# Altium footprint library devices.PCBLIB: 335 footprints (part 15 of 21)
Each footprint in its own frame and in the unit in brackets; x right, y up, seen from the top. Pads: shape width x height; smd on the part's side, far side on the other; paste and mask are expansions set on the pad; w line width, h text height; cw(c..) or ccw(c..) is an arc to the next point about the centre after c.
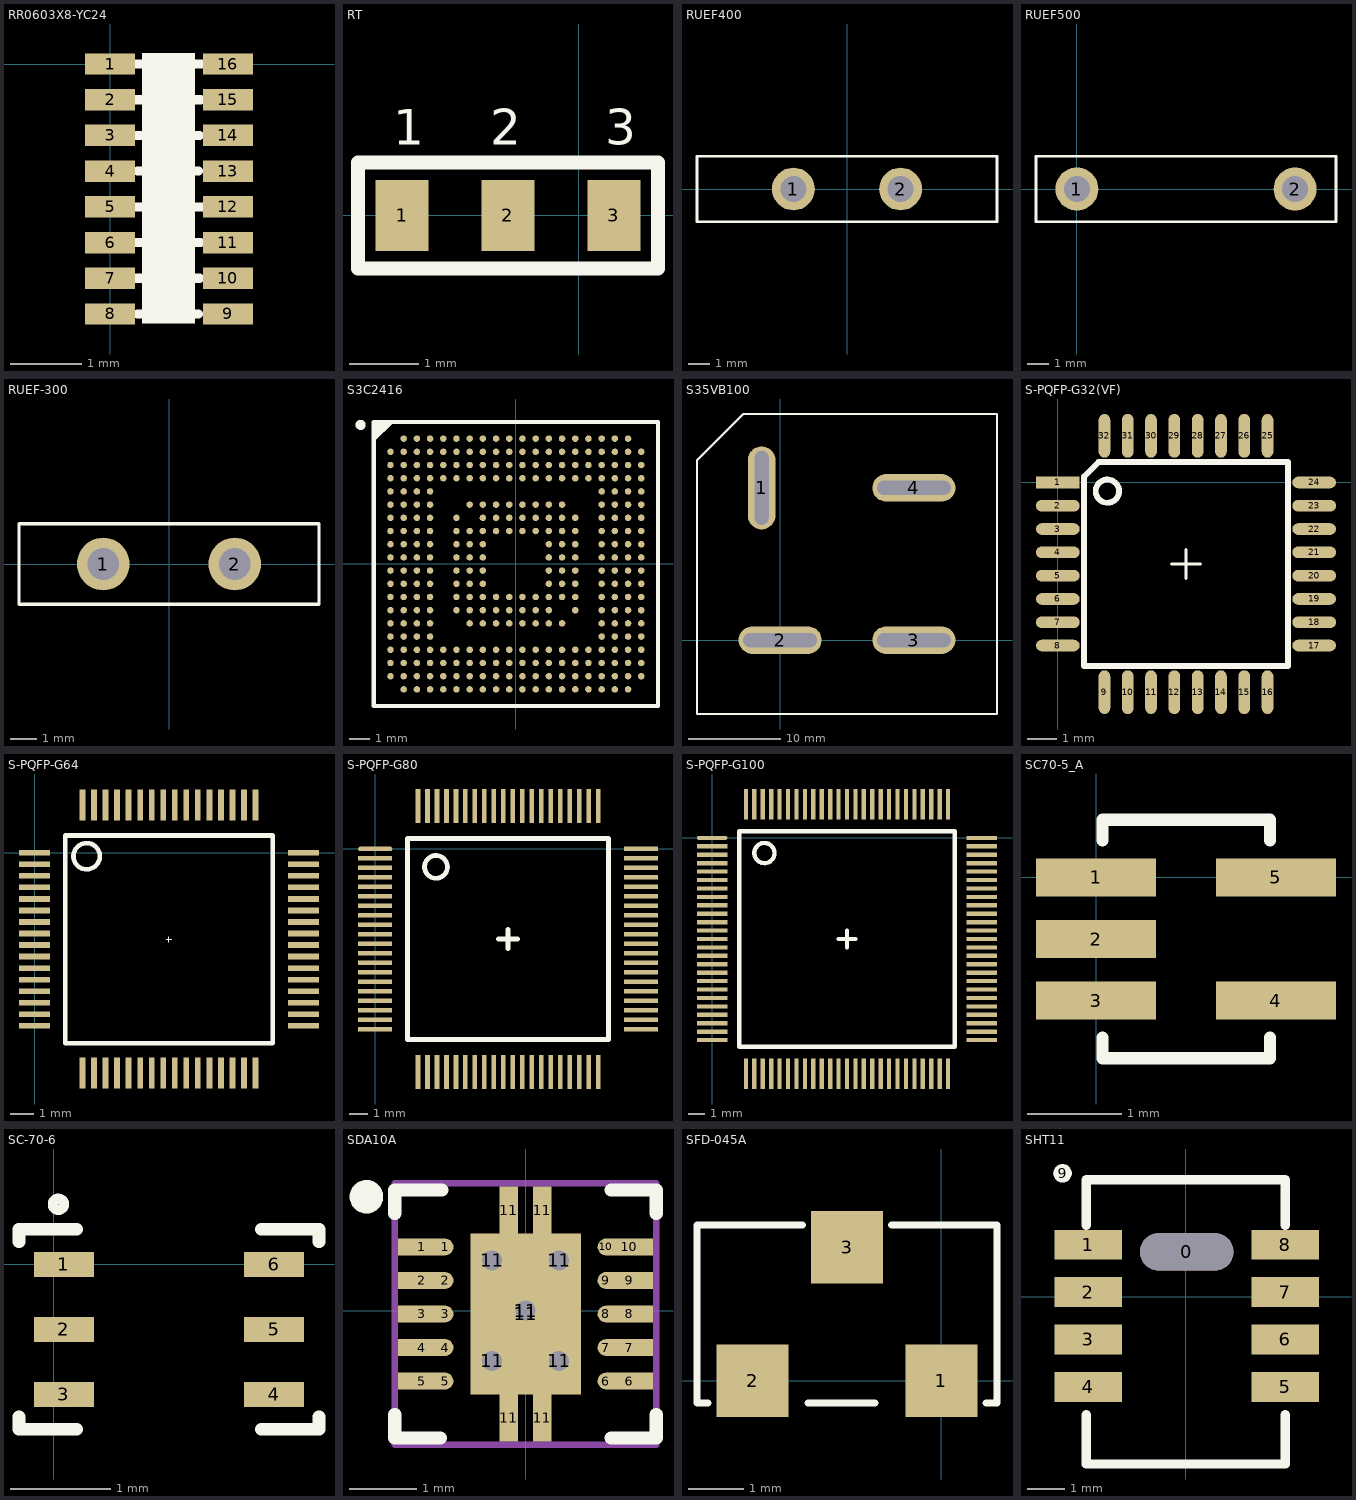
[diagram p14: the footprints below, top view; thin cyan lines are the x and y axes]

## RR0603X8-YC24 [mm]
pads (16):
  rect 0.7x0.3 smd: 1(0,0) 2(0,-0.5) 3(0,-1) 4(0,-1.5) 5(0,-2) 6(0,-2.5) 7(0,-3) 8(0,-3.5) 9(1.65,-3.5) 10(1.65,-3) 11(1.65,-2.5) 12(1.65,-2) 13(1.65,-1.5) 14(1.65,-1) 15(1.65,-0.5) 16(1.65,0)
Top Overlay:
  rectangle: 0.45,-3.632 1.19,0.157
  lines w0.127: 0.37,-3 1.25,-3 ; 0.37,-2.5 1.27,-2.5 ; 0.37,-2 1.28,-2 ; 0.37,-1 1.25,-1 ; 0.37,-0.5 1.27,-0.5 ; 0.37,0 1.28,0 ; 0.38,-3.5 1.24,-3.5 ; 0.38,-1.5 1.24,-1.5

## RT [mil]
pads (3):
  rect 30x40 smd: 1(-100,0) 2(-40,0) 3(20,0)
Top Overlay:
  lines w7.87: -125,-30 45,-30 45,30 -125,30 -125,-30
  text "1" at -105,40 h20
  text "2" at -50,40 h20
  text "3" at 15,40 h20

## RUEF400 [mm]
pads (2):
  round 2 hole 1.2: 1(-2.5,0) 2(2.5,0)
Top Overlay:
  lines w0.127: -7,-1.524 7,-1.524 7,1.524 -7,1.524 -7,-1.524

## RUEF500 [mm]
pads (2):
  round 2 hole 1.2: 1(0,0) 2(10.16,0)
Top Overlay:
  lines w0.127: -1.905,-1.524 -1.905,1.524 12.065,1.524 12.065,-1.524 -1.905,-1.524

## RUEF-300 [mm]
pads (2):
  round 2 hole 1.2: 1(-2.5,0) 2(2.5,0)
Top Overlay:
  lines w0.127: -5.7,-1.524 -5.7,1.524 5.7,1.524 5.7,-1.524 -5.7,-1.524

## S3C2416 [mm] "BGA, 330-Leads, Body 14.0x14.0mm,  Pitch 0.65mm"
height 3.5
pads (330):
  round 0.32 smd: A2(-5.525,6.175) A3(-4.875,6.175) A4(-4.225,6.175) A5(-3.575,6.175) A6(-2.925,6.175) A7(-2.275,6.175) A8(-1.625,6.175) A9(-0.975,6.175) A10(-0.325,6.175) A11(0.325,6.175) A12(0.975,6.175) A13(1.625,6.175) A14(2.275,6.175) A15(2.925,6.175) A16(3.575,6.175) A17(4.225,6.175) A18(4.875,6.175) A19(5.525,6.175) B1(-6.175,5.525) B2(-5.525,5.525) B3(-4.875,5.525) B4(-4.225,5.525) B5(-3.575,5.525) B6(-2.925,5.525) B7(-2.275,5.525) B8(-1.625,5.525) B9(-0.975,5.525) B10(-0.325,5.525) B11(0.325,5.525) B12(0.975,5.525) B13(1.625,5.525) B14(2.275,5.525) B15(2.925,5.525) B16(3.575,5.525) B17(4.225,5.525) B18(4.875,5.525) B19(5.525,5.525) B20(6.175,5.525) C1(-6.175,4.875) C2(-5.525,4.875) C3(-4.875,4.875) C4(-4.225,4.875) C5(-3.575,4.875) C6(-2.925,4.875) C7(-2.275,4.875) C8(-1.625,4.875) C9(-0.975,4.875) C10(-0.325,4.875) C11(0.325,4.875) C12(0.975,4.875) C13(1.625,4.875) C14(2.275,4.875) C15(2.925,4.875) C16(3.575,4.875) C17(4.225,4.875) C18(4.875,4.875) C19(5.525,4.875) C20(6.175,4.875) D1(-6.175,4.225) D2(-5.525,4.225) D3(-4.875,4.225) D4(-4.225,4.225) D5(-3.575,4.225) D6(-2.925,4.225) D7(-2.275,4.225) D8(-1.625,4.225) D9(-0.975,4.225) D10(-0.325,4.225) D11(0.325,4.225) D12(0.975,4.225) D13(1.625,4.225) D14(2.275,4.225) D15(2.925,4.225) D16(3.575,4.225) D17(4.225,4.225) D18(4.875,4.225) D19(5.525,4.225) D20(6.175,4.225) E1(-6.175,3.575) E2(-5.525,3.575) E3(-4.875,3.575) E4(-4.225,3.575) E17(4.225,3.575) E18(4.875,3.575) E19(5.525,3.575) E20(6.175,3.575) F1(-6.175,2.925) F2(-5.525,2.925) F3(-4.875,2.925) F4(-4.225,2.925) F7(-2.275,2.925) F8(-1.625,2.925) F9(-0.975,2.925) F10(-0.325,2.925) F11(0.325,2.925) F12(0.975,2.925) F13(1.625,2.925) F14(2.275,2.925) F17(4.225,2.925) F18(4.875,2.925) F19(5.525,2.925) F20(6.175,2.925) G1(-6.175,2.275) G2(-5.525,2.275) G3(-4.875,2.275) G4(-4.225,2.275) G6(-2.925,2.275) G8(-1.625,2.275) G9(-0.975,2.275) G10(-0.325,2.275) G11(0.325,2.275) G12(0.975,2.275) G13(1.625,2.275) G14(2.275,2.275) G15(2.925,2.275) G17(4.225,2.275) G18(4.875,2.275) G19(5.525,2.275) G20(6.175,2.275) H1(-6.175,1.625) H2(-5.525,1.625) H3(-4.875,1.625) H4(-4.225,1.625) H6(-2.925,1.625) H7(-2.275,1.625) H8(-1.625,1.625) H9(-0.975,1.625) H10(-0.325,1.625) H11(0.325,1.625) H12(0.975,1.625) H13(1.625,1.625) H14(2.275,1.625) H15(2.925,1.625) H17(4.225,1.625) H18(4.875,1.625) H19(5.525,1.625) H20(6.175,1.625) J1(-6.175,0.975) J2(-5.525,0.975) J3(-4.875,0.975) J4(-4.225,0.975) J6(-2.925,0.975) J7(-2.275,0.975) J8(-1.625,0.975) J13(1.625,0.975) J14(2.275,0.975) J15(2.925,0.975) J17(4.225,0.975) J18(4.875,0.975) J19(5.525,0.975) J20(6.175,0.975) K1(-6.175,0.325) K2(-5.525,0.325) K3(-4.875,0.325) K4(-4.225,0.325) K6(-2.925,0.325) K7(-2.275,0.325) K8(-1.625,0.325) K13(1.625,0.325) K14(2.275,0.325) K15(2.925,0.325) K17(4.225,0.325) K18(4.875,0.325) K19(5.525,0.325) K20(6.175,0.325) L1(-6.175,-0.325) L2(-5.525,-0.325) L3(-4.875,-0.325) L4(-4.225,-0.325) L6(-2.925,-0.325) L7(-2.275,-0.325) L8(-1.625,-0.325) L13(1.625,-0.325) L14(2.275,-0.325) L15(2.925,-0.325) L17(4.225,-0.325) L18(4.875,-0.325) L19(5.525,-0.325) L20(6.175,-0.325) M1(-6.175,-0.975) M2(-5.525,-0.975) M3(-4.875,-0.975) M4(-4.225,-0.975) M6(-2.925,-0.975) M7(-2.275,-0.975) M8(-1.625,-0.975) M13(1.625,-0.975) M14(2.275,-0.975) M15(2.925,-0.975) M17(4.225,-0.975) M18(4.875,-0.975) M19(5.525,-0.975) M20(6.175,-0.975) N1(-6.175,-1.625) N2(-5.525,-1.625) N3(-4.875,-1.625) N4(-4.225,-1.625) N6(-2.925,-1.625) N7(-2.275,-1.625) N8(-1.625,-1.625) N9(-0.975,-1.625) N10(-0.325,-1.625) N11(0.325,-1.625) N12(0.975,-1.625) N13(1.625,-1.625) N14(2.275,-1.625) N15(2.925,-1.625) N17(4.225,-1.625) N18(4.875,-1.625) N19(5.525,-1.625) N20(6.175,-1.625) P1(-6.175,-2.275) P2(-5.525,-2.275) P3(-4.875,-2.275) P4(-4.225,-2.275) P6(-2.925,-2.275) P7(-2.275,-2.275) P8(-1.625,-2.275) P9(-0.975,-2.275) P10(-0.325,-2.275) P11(0.325,-2.275) P12(0.975,-2.275) P13(1.625,-2.275) P15(2.925,-2.275) P17(4.225,-2.275) P18(4.875,-2.275) P19(5.525,-2.275) P20(6.175,-2.275) R1(-6.175,-2.925) R2(-5.525,-2.925) R3(-4.875,-2.925) R4(-4.225,-2.925) R7(-2.275,-2.925) R8(-1.625,-2.925) R9(-0.975,-2.925) R10(-0.325,-2.925) R11(0.325,-2.925) R12(0.975,-2.925) R13(1.625,-2.925) R14(2.275,-2.925) R17(4.225,-2.925) R18(4.875,-2.925) R19(5.525,-2.925) R20(6.175,-2.925) T1(-6.175,-3.575) T2(-5.525,-3.575) T3(-4.875,-3.575) T4(-4.225,-3.575) T17(4.225,-3.575) T18(4.875,-3.575) T19(5.525,-3.575) T20(6.175,-3.575) U1(-6.175,-4.225) U2(-5.525,-4.225) U3(-4.875,-4.225) U4(-4.225,-4.225) U5(-3.575,-4.225) U6(-2.925,-4.225) U7(-2.275,-4.225) U8(-1.625,-4.225) U9(-0.975,-4.225) U10(-0.325,-4.225) U11(0.325,-4.225) U12(0.975,-4.225) U13(1.625,-4.225) U14(2.275,-4.225) U15(2.925,-4.225) U16(3.575,-4.225) U17(4.225,-4.225) U18(4.875,-4.225) U19(5.525,-4.225) U20(6.175,-4.225) V1(-6.175,-4.875) V2(-5.525,-4.875) V3(-4.875,-4.875) V4(-4.225,-4.875) V5(-3.575,-4.875) V6(-2.925,-4.875) V7(-2.275,-4.875) V8(-1.625,-4.875) V9(-0.975,-4.875) V10(-0.325,-4.875) V11(0.325,-4.875) V12(0.975,-4.875) V13(1.625,-4.875) V14(2.275,-4.875) V15(2.925,-4.875) V16(3.575,-4.875) V17(4.225,-4.875) V18(4.875,-4.875) V19(5.525,-4.875) V20(6.175,-4.875) W1(-6.175,-5.525) W2(-5.525,-5.525) W3(-4.875,-5.525) W4(-4.225,-5.525) W5(-3.575,-5.525) W6(-2.925,-5.525) W7(-2.275,-5.525) W8(-1.625,-5.525) W9(-0.975,-5.525) W10(-0.325,-5.525) W11(0.325,-5.525) W12(0.975,-5.525) W13(1.625,-5.525) W14(2.275,-5.525) W15(2.925,-5.525) W16(3.575,-5.525) W17(4.225,-5.525) W18(4.875,-5.525) W19(5.525,-5.525) W20(6.175,-5.525) Y2(-5.525,-6.175) Y3(-4.875,-6.175) Y4(-4.225,-6.175) Y5(-3.575,-6.175) Y6(-2.925,-6.175) Y7(-2.275,-6.175) Y8(-1.625,-6.175) Y9(-0.975,-6.175) Y10(-0.325,-6.175) Y11(0.325,-6.175) Y12(0.975,-6.175) Y13(1.625,-6.175) Y14(2.275,-6.175) Y15(2.925,-6.175) Y16(3.575,-6.175) Y17(4.225,-6.175) Y18(4.875,-6.175) Y19(5.525,-6.175)
Top Overlay:
  circle w0.25: c-7.65,6.85 r0.125
  region: -6.121,7 -7,6.121 -7,7
  lines w0.2: -7,6.121 -6.121,7 ; -7,-7 -7,7 7,7 7,-7 -7,-7

## S35VB100 [mm]
pads (4):
  oval 3x9 hole 1.5 slot 8 at 90 deg: 1(-2,16.5)
  oval 9x3 hole 1.5 slot 8 at 0 deg: 2(0,0) 3(14.5,0) 4(14.5,16.5)
Top Overlay:
  lines w0.254: -9,-8 -9,19.5 -4,24.5 23.5,24.5 23.5,-8 -9,-8

## S-PQFP-G32(VF) [mm]
pads (32):
  rect 1.5x0.4 smd: 1(0,0)
  oval 1.5x0.4 smd: 2(0,-0.8) 3(0,-1.6) 4(0,-2.4) 5(0,-3.2) 6(0,-4) 7(0,-4.8) 8(0,-5.6) 17(8.8,-5.6) 18(8.8,-4.8) 19(8.8,-4) 20(8.8,-3.2) 21(8.8,-2.4) 22(8.8,-1.6) 23(8.8,-0.8) 24(8.8,0)
  oval 0.4x1.5 smd: 9(1.6,-7.2) 10(2.4,-7.2) 11(3.2,-7.2) 12(4,-7.2) 13(4.8,-7.2) 14(5.6,-7.2) 15(6.4,-7.2) 16(7.2,-7.2) 25(7.2,1.6) 26(6.4,1.6) 27(5.6,1.6) 28(4.8,1.6) 29(4,1.6) 30(3.2,1.6) 31(2.4,1.6) 32(1.6,1.6)
Top Overlay:
  circle w0.2: c1.7,-0.3 r0.4
  lines w0.1: 3.9,-2.8 4.9,-2.8 ; 4.4,-3.3 4.4,-2.3
  lines w0.2: 0.9,-6.3 7.9,-6.3 7.9,0.7 1.4,0.7 0.9,0.2 0.9,-6.3

## S-PQFP-G64 [mm]
pads (64):
  rect 1.35x0.25 smd: 1(0,0) 2(0,-0.5) 3(0,-1) 4(0,-1.5) 5(0,-2) 6(0,-2.5) 7(0,-3) 8(0,-3.5) 9(0,-4) 10(0,-4.5) 11(0,-5) 12(0,-5.5) 13(0,-6) 14(0,-6.5) 15(0,-7) 16(0,-7.5) 33(11.65,-7.5) 34(11.65,-7) 35(11.65,-6.5) 36(11.65,-6) 37(11.65,-5.5) 38(11.65,-5) 39(11.65,-4.5) 40(11.65,-4) 41(11.65,-3.5) 42(11.65,-3) 43(11.65,-2.5) 44(11.65,-2) 45(11.65,-1.5) 46(11.65,-1) 47(11.65,-0.5) 48(11.65,0)
  rect 0.25x1.35 smd: 17(2.075,-9.55) 18(2.575,-9.55) 19(3.075,-9.55) 20(3.575,-9.55) 21(4.075,-9.55) 22(4.575,-9.55) 23(5.075,-9.55) 24(5.575,-9.55) 25(6.075,-9.55) 26(6.575,-9.55) 27(7.075,-9.55) 28(7.575,-9.55) 29(8.075,-9.55) 30(8.575,-9.55) 31(9.075,-9.55) 32(9.575,-9.55) 49(9.575,2.075) 50(9.075,2.075) 51(8.575,2.075) 52(8.075,2.075) 53(7.575,2.075) 54(7.075,2.075) 55(6.575,2.075) 56(6.075,2.075) 57(5.575,2.075) 58(5.075,2.075) 59(4.575,2.075) 60(4.075,2.075) 61(3.575,2.075) 62(3.075,2.075) 63(2.575,2.075) 64(2.075,2.075)
Top Overlay:
  circle w0.2: c2.255,-0.15 r0.57
  lines w0.001: 5.705,-3.75 5.945,-3.75 ; 5.825,-3.87 5.825,-3.63
  lines w0.2: 1.325,-8.25 10.325,-8.25 10.325,0.75 1.325,0.75 1.325,-8.25

## S-PQFP-G80 [mm]
pads (80):
  oval 1.8x0.25 smd: 1(0,0)
  rect 1.8x0.25 smd: 2(-0.008,-0.5) 3(-0.008,-1) 4(-0.008,-1.5) 5(-0.008,-2) 6(-0.008,-2.5) 7(-0.008,-3) 8(-0.008,-3.5) 9(-0.008,-4) 10(-0.008,-4.5) 11(-0.008,-5) 12(-0.008,-5.5) 13(-0.008,-6) 14(-0.008,-6.5) 15(-0.008,-7) 16(-0.008,-7.5) 17(-0.008,-8) 18(-0.008,-8.5) 19(-0.008,-9) 20(-0.008,-9.5) 41(14,-9.5) 42(14,-9) 43(14,-8.5) 44(14,-8) 45(14,-7.5) 46(14,-7) 47(14,-6.5) 48(14,-6) 49(14,-5.5) 50(14,-5) 51(14,-4.5) 52(14,-4) 53(14,-3.5) 54(14,-3) 55(14,-2.5) 56(14,-2) 57(14,-1.5) 58(14,-1) 59(14,-0.5) 60(14,0)
  rect 0.25x1.8 smd: 21(2.25,-11.75) 22(2.75,-11.75) 23(3.25,-11.75) 24(3.75,-11.75) 25(4.25,-11.75) 26(4.75,-11.75) 27(5.25,-11.75) 28(5.75,-11.75) 29(6.25,-11.75) 30(6.75,-11.75) 31(7.25,-11.75) 32(7.75,-11.75) 33(8.25,-11.75) 34(8.75,-11.75) 35(9.25,-11.75) 36(9.75,-11.75) 37(10.25,-11.75) 38(10.75,-11.75) 39(11.25,-11.75) 40(11.75,-11.75) 61(11.75,2.25) 62(11.25,2.25) 63(10.75,2.25) 64(10.25,2.25) 65(9.75,2.25) 66(9.25,2.25) 67(8.75,2.25) 68(8.25,2.25) 69(7.75,2.25) 70(7.25,2.25) 71(6.75,2.25) 72(6.25,2.25) 73(5.75,2.25) 74(5.25,2.25) 75(4.75,2.25) 76(4.25,2.25) 77(3.75,2.25) 78(3.25,2.25) 79(2.75,2.25) 80(2.25,2.25)
Top Overlay:
  circle w0.254: c3.2,-0.95 r0.6
  lines w0.254: 6.5,-4.75 7.5,-4.75 ; 7,-5.25 7,-4.25 ; 1.7,-10.05 12.3,-10.05 12.3,0.55 1.7,0.55 1.7,-10.05

## S-PQFP-G100 [mm]
pads (100):
  oval 1.8x0.25 smd: 1(0,0)
  rect 1.8x0.25 smd: 2(0,-0.5) 3(0,-1) 4(0,-1.5) 5(0,-2) 6(0,-2.5) 7(0,-3) 8(0,-3.5) 9(0,-4) 10(0,-4.5) 11(0,-5) 12(0,-5.5) 13(0,-6) 14(0,-6.5) 15(0,-7) 16(0,-7.5) 17(0,-8) 18(0,-8.5) 19(0,-9) 20(0,-9.5) 21(0,-10) 22(0,-10.5) 23(0,-11) 24(0,-11.5) 25(0,-12) 51(16,-12) 52(16,-11.5) 53(16,-11) 54(16,-10.5) 55(16,-10) 56(16,-9.5) 57(16,-9) 58(16,-8.5) 59(16,-8) 60(16,-7.5) 61(16,-7) 62(16,-6.5) 63(16,-6) 64(16,-5.5) 65(16,-5) 66(16,-4.5) 67(16,-4) 68(16,-3.5) 69(16,-3) 70(16,-2.5) 71(16,-2) 72(16,-1.5) 73(16,-1) 74(16,-0.5) 75(16,0)
  rect 0.25x1.8 smd: 26(2,-14) 27(2.5,-14) 28(3,-14) 29(3.5,-14) 30(4,-14) 31(4.5,-14) 32(5,-14) 33(5.5,-14) 34(6,-14) 35(6.5,-14) 36(7,-14) 37(7.5,-14) 38(8,-14) 39(8.5,-14) 40(9,-14) 41(9.5,-14) 42(10,-14) 43(10.5,-14) 44(11,-14) 45(11.5,-14) 46(12,-14) 47(12.5,-14) 48(13,-14) 49(13.5,-14) 50(14,-14) 76(14,2) 77(13.5,2) 78(13,2) 79(12.5,2) 80(12,2) 81(11.5,2) 82(11,2) 83(10.5,2) 84(10,2) 85(9.5,2) 86(9,2) 87(8.5,2) 88(8,2) 89(7.5,2) 90(7,2) 91(6.5,2) 92(6,2) 93(5.5,2) 94(5,2) 95(4.5,2) 96(4,2) 97(3.5,2) 98(3,2) 99(2.5,2) 100(2,2)
Top Overlay:
  circle w0.254: c3.1,-0.9 r0.6
  lines w0.254: 7.5,-6 8.5,-6 ; 8,-6.5 8,-5.5 ; 1.6,-12.4 1.6,0.4 14.4,0.4 14.4,-12.4 1.6,-12.4

## SC70-5_A [mil]
pads (5):
  rect 50x16 smd: 1(0,0) 2(0,-25.59) 3(0,-51.18) 4(74.8,-51.18) 5(74.8,0)
Top Overlay:
  lines w5: 2.75,-66.53 2.75,-75.2 72.44,-75.2 72.44,-66.53 ; 2.75,15.35 2.75,24.02 72.44,24.02 72.44,15.35

## SC-70-6 [mm]
pads (6):
  rect 0.6x0.25 smd paste-0.125 mask+0.051: 1(0.1,0) 2(0.1,-0.65) 3(0.1,-1.3) 4(2.2,-1.3) 5(2.2,-0.65) 6(2.2,0)
Top Overlay:
  circle w0.102: c0.044,0.6 r0.056
  lines w0.127: -0.35,-1.525 -0.35,-1.65 0.225,-1.65 ; -0.35,0.225 -0.35,0.35 0.225,0.35 ; 2.075,-1.65 2.65,-1.65 2.65,-1.525 ; 2.075,0.35 2.65,0.35 2.65,0.225

## SDA10A [mm] "SON, 10-Leads, Body 3x3 mm, Pitch 0.5mm, NSC Recommended"
height 0.8
pads (30):
  rect 0.7x0.25 smd paste-0.125 mask+0.051: 1(-1.55,0.95) 2(-1.55,0.45) 3(-1.55,-0.05) 4(-1.55,-0.55) 5(-1.55,-1.05) 6(1.55,-1.05) 7(1.55,-0.55) 8(1.55,-0.05) 9(1.55,0.45) 10(1.55,0.95)
  round 0.25 smd: 1(-1.2,0.95) 2(-1.2,0.45) 3(-1.2,-0.05) 4(-1.2,-0.55) 5(-1.2,-1.05) 6(1.2,-1.05) 7(1.2,-0.55) 8(1.2,-0.05) 9(1.2,0.45) 10(1.2,0.95)
  round 0.5 hole 0.3: 11(-0.5,-0.75) 11(-0.5,0.75) 11(0,0) 11(0.5,-0.75) 11(0.5,0.75)
  rect 0.28x0.7 smd paste-0.125 mask+0.051: 11(-0.25,-1.6) 11(-0.25,1.5) 11(0.25,-1.6) 11(0.25,1.5)
  rect 1.65x2.4 smd paste-0.05 mask+0.051: 11(0,-0.05)
Top Overlay:
  circle w0.25: c-2.375,1.7 r0.125
  lines w0.2: -1.95,-1.55 -1.95,-1.9 ; -1.95,1.45 -1.95,1.8 -1.25,1.8 ; 1.85,1.8 1.275,1.8 1.95,1.8 1.95,1.45 ; 1.95,-1.55 1.95,-1.9 ; -1.95,-1.9 -1.275,-1.9 -1.95,-1.9 ; 1.95,-1.9 1.275,-1.9 1.95,-1.9
Top Paste:
  region: 1.976,1.075 1.276,1.075 1.276,0.825 1.976,0.825
  region: 1.976,0.575 1.276,0.575 1.276,0.325 1.976,0.325
  rectangle: -1.976,0.825 -1.276,1.075
  rectangle: -1.976,0.325 -1.276,0.575
  rectangle: -1.976,-0.175 -1.276,0.075
  rectangle: -1.976,-0.675 -1.276,-0.425
  rectangle: -1.976,-1.175 -1.276,-0.925
  region: 1.976,0.075 1.276,0.075 1.276,-0.175 1.976,-0.175
  region: 1.976,-0.425 1.276,-0.425 1.276,-0.675 1.976,-0.675
  region: 1.976,-0.925 1.276,-0.925 1.276,-1.175 1.976,-1.175
Mechanical 15:
  lines w0.1: -0.5,-0.05 0.5,-0.05 ; 0,-0.55 0,0.45 ; -1.95,-2 1.95,-2 ; -1.95,-2 -1.95,1.9 1.95,1.9 1.95,-2 ; -1.95,-2 1.95,-2

## SFD-045A [mm]
pads (3):
  rect 1.3x1.3 smd: 1(0,0) 2(-3.4,0) 3(-1.7,2.4)
Top Overlay:
  lines w0.127: -4.2,-0.4 -4.4,-0.4 -4.4,2.8 -2.5,2.8 ; -2.4,-0.4 -1.2,-0.4 ; -0.9,2.8 1,2.8 1,-0.4 0.8,-0.4

## SHT11 [mm]
pads (10):
  oval 2.5x1 hole 1 slot 2.5 at 0 deg: 0(0.028,1.198)
  rect 1.8x0.8 smd: 1(-2.612,1.388) 2(-2.612,0.118) 3(-2.612,-1.152) 4(-2.612,-2.422) 5(2.668,-2.422) 6(2.668,-1.152) 7(2.668,0.118) 8(2.668,1.388)
  round 0.5 on Top Overlay: 9(-3.302,3.302)
Top Overlay:
  lines w0.254: -2.668,-3.176 -2.668,-4.49 2.668,-4.49 2.668,-3.174 ; -2.668,1.906 -2.668,3.13 2.668,3.13 2.668,1.906